# Altium footprint library SVP_Shared.PcbLib: 57 footprints (part 2 of 4)
Each footprint in its own frame and in the unit in brackets; x right, y up, seen from the top. Pads: shape width x height; smd on the part's side, far side on the other; paste and mask are expansions set on the pad; w line width, h text height; cw(c..) or ccw(c..) is an arc to the next point about the centre after c.
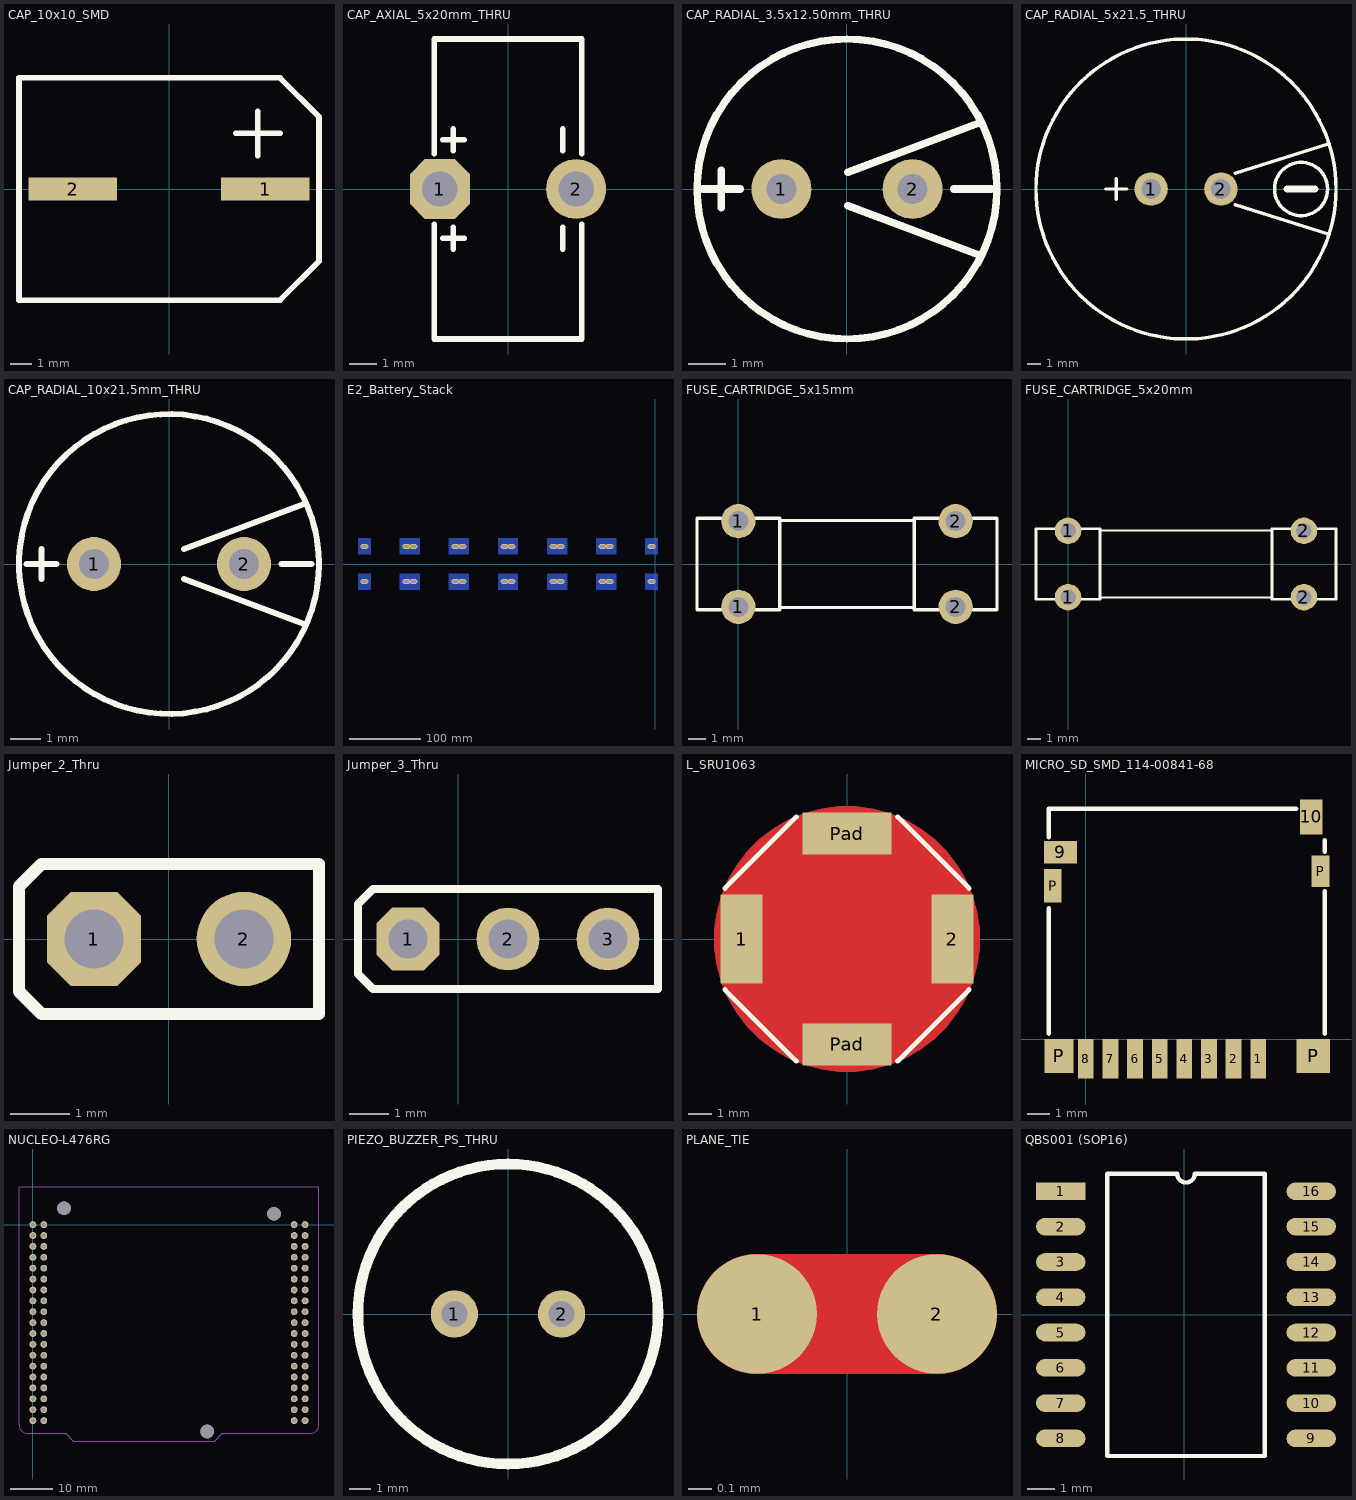
[diagram p1: the footprints below, top view; thin cyan lines are the x and y axes]

## CAP_10x10_SMD [mm]
pads (2):
  rect 4.064x1.05 smd: 1(4.4,0) 2(-4.4,0)
Top Overlay:
  lines w0.254: 3.048,2.54 5.08,2.54 ; 4.064,1.524 4.064,3.556 ; -6.858,-5.08 5.08,-5.08 6.858,-3.302 6.858,3.302 5.08,5.08 -6.858,5.08 -6.858,-5.08
3D body "User Library-cap_10x10x10-1.STEP": height 10.51, standoff 0.01, extent -5.899,-5.25 5.901,5.25

## CAP_AXIAL_5x20mm_THRU [mm] "Axial, Can - Vertical"
height 19.5
pads (2):
  oct 2.2x2.2 hole 1.3: 1(-2.5,0)
  round 2.2 hole 1.3: 2(2.5,0)
Top Overlay:
  lines w0.203: -2.7,-1.3 -2.7,-5.5 2.7,-5.5 2.7,-1.3 ; -2.7,1.3 -2.7,5.5 2.7,5.5 2.7,1.3 ; -2.4,-1.8 -1.6,-1.8 ; -2.4,1.8 -1.6,1.8 ; -2,-2.2 -2,-1.4 ; -2,1.4 -2,2.2 ; 2,-2.2 2,-1.4 ; 2,1.4 2,2.2
3D body: height 19.5, standoff 0.5, extent -2.5,-9.497 2.5,9.497
3D body: height 10, standoff -3, extent -2.7,-0.5 -2.5,0.5
3D body: height 17, standoff 3, extent -2.7,-7.098 -2.5,6.898
3D body: height 17, standoff 3, extent 2.5,-6.898 2.7,7.098
3D body: height 10, standoff -3, extent 2.5,-0.5 2.7,0.5

## CAP_RADIAL_3.5x12.50mm_THRU [mm]
height 12.5
pads (2):
  round 1.6 hole 0.8: 1(-1.75,0) 2(1.75,0)
Top Overlay:
  circle w0.2: c0,0 r4
  lines w0.203: -3.85,0 -2.85,0 ; -3.35,-0.5 -3.35,0.5 ; 0.021,-0.445 3.517,-1.756 ; 0.021,0.445 3.517,1.756 ; 2.85,0 3.85,0
3D body "User Library-Cap-EL(8x12-3_5)T.step": height 12.31, standoff -3.29, extent -4,-4 4.002,4

## CAP_RADIAL_5x21.5_THRU [mm] "Radial Capacitor 5mm lead spacing, 21.5mm diameter, 8mm tall"
height 8
pads (2):
  round 2.4 hole 1.4: 1(-2.5,0) 2(2.5,0)
Top Overlay:
  circle w0.25: c0,0 r10.75
  circle w0.25: c8.25,0 r1.904
  lines w0.25: -5.75,0 -4.25,0 ; -5,-0.75 -5,0.75 ; 3.54,-1.123 10.25,-3.25 ; 3.54,1.123 10.25,3.25
  lines w0.5: 7.25,0 9.25,0
3D body "User Library-Ionistor.step": height 8.01, standoff -6, extent -10.75,-10.75 10.76,10.75

## CAP_RADIAL_10x21.5mm_THRU [mm] "Aluminum Capacitor Radial"
height 21.5
pads (2):
  round 1.8 hole 1: 1(-2.5,0) 2(2.5,0)
Top Overlay:
  circle w0.2: c0,0 r5
  lines w0.203: -4.75,0 -3.75,0 ; -4.25,-0.5 -4.25,0.5 ; 0.5,-0.5 4.5,-2 ; 0.5,0.5 4.5,2 ; 3.75,0 4.75,0
3D body "User Library-Cap-EL(10x20-5).step": height 20, standoff -3.3, extent -5,-5 5.002,5

## E2_Battery_Stack [mil] "Preliminary Battery Stack for E2"
pads (24):
  oval 440x260 hole 120 slot 300 at 0 deg: 1(-196.85,969.27) 2(-2913.39,969.27) 2(-2519.68,969.27) 3(-5629.92,969.26) 3(-5236.22,969.26) 4(-8346.46,969.26) 4(-7952.76,969.26) 5(-11062.99,969.25) 5(-10669.29,969.25) 6(-13779.53,969.25) 6(-13385.83,969.25) 7(-16102.36,-969.24) 7(-16102.36,969.24) 8(-13779.53,-969.25) 8(-13385.83,-969.25) 9(-11062.99,-969.25) 9(-10669.29,-969.25) 10(-8346.46,-969.26) 10(-7952.76,-969.26) 11(-5629.92,-969.26) 11(-5236.22,-969.26) 12(-2913.39,-969.27) 12(-2519.68,-969.27) 13(-196.85,-969.27)
Top Layer:
  lines w256: -13779.53,-969.25 -13385.83,-969.25 ; -13779.53,969.25 -13385.83,969.25 ; -11062.99,-969.25 -10669.29,-969.25 ; -11062.99,969.25 -10669.29,969.25 ; -8346.46,-969.26 -7952.76,-969.26 ; -8346.46,969.26 -7952.76,969.26 ; -5629.92,-969.26 -5236.22,-969.26 ; -5629.92,969.26 -5236.22,969.26 ; -2913.39,-969.27 -2519.68,-969.27 ; -2913.39,969.27 -2519.68,969.27
Bottom Layer:
  pour cut-out: -14133.86,-551.16 -14133.86,-1417.3 -13031.5,-1417.3 -13031.5,-551.16
  pour cut-out: -3267.72,-551.18 -3267.72,-1417.32 -2165.35,-1417.32 -2165.35,-551.18
  pour cut-out: -551.18,-551.18 -551.18,-1417.32 157.48,-1417.32 157.48,-551.18
  pour cut-out: -11417.32,-551.16 -11417.32,-1417.3 -10314.96,-1417.3 -10314.96,-551.16
  pour cut-out: -8700.79,-551.17 -8700.79,-1417.31 -7598.43,-1417.31 -7598.43,-551.17
  pour cut-out: -5984.25,-551.17 -5984.25,-1417.31 -4881.89,-1417.31 -4881.89,-551.17
  pour cut-out: -16456.69,-551.15 -16456.69,-1417.29 -15748.03,-1417.29 -15748.03,-551.15
  pour cut-out: -16456.69,551.15 -16456.69,1417.29 -15748.03,1417.29 -15748.03,551.15
  pour cut-out: -5984.25,551.17 -5984.25,1417.31 -4881.89,1417.31 -4881.89,551.17
  pour cut-out: -8700.79,551.17 -8700.79,1417.31 -7598.43,1417.31 -7598.43,551.17
  pour cut-out: -11417.32,551.16 -11417.32,1417.3 -10314.96,1417.3 -10314.96,551.16
  pour cut-out: -551.18,551.18 -551.18,1417.32 157.48,1417.32 157.48,551.18
  pour cut-out: -3267.72,551.18 -3267.72,1417.32 -2165.35,1417.32 -2165.35,551.18
  pour cut-out: -14133.86,551.16 -14133.86,1417.3 -13031.5,1417.3 -13031.5,551.16
  lines w256: -13779.53,-969.25 -13385.83,-969.25 ; -13779.53,969.25 -13385.83,969.25 ; -11062.99,-969.25 -10669.29,-969.25 ; -11062.99,969.25 -10669.29,969.25 ; -8346.46,-969.26 -7952.76,-969.26 ; -8346.46,969.26 -7952.76,969.26 ; -5629.92,-969.26 -5236.22,-969.26 ; -5629.92,969.26 -5236.22,969.26 ; -2913.39,-969.27 -2519.68,-969.27 ; -2913.39,969.27 -2519.68,969.27
3D body "E2_BatteryStackConcept.STEP": height 2616.64, standoff 0.49, extent -16377.95,-2712.93 0,2712.94
3D body "92196A108_18-8 STAINLESS STEEL SOCKET HEAD CAP SCREW.STEP": height 112.5, standoff -374.5, extent -288.35,877.77 -105.34,1060.77
3D body "92196A108_18-8 STAINLESS STEEL SOCKET HEAD CAP SCREW.STEP": height 112.5, standoff -374.5, extent -2611.18,877.77 -2428.18,1060.77
3D body "92196A108_18-8 STAINLESS STEEL SOCKET HEAD CAP SCREW.STEP": height 112.5, standoff -374.5, extent -3004.88,877.77 -2821.88,1060.77
3D body "92196A108_18-8 STAINLESS STEEL SOCKET HEAD CAP SCREW.STEP": height 112.5, standoff -374.5, extent -5327.72,877.76 -5144.71,1060.76
3D body "92196A108_18-8 STAINLESS STEEL SOCKET HEAD CAP SCREW.STEP": height 112.5, standoff -374.5, extent -5721.42,877.76 -5538.42,1060.76
3D body "92196A108_18-8 STAINLESS STEEL SOCKET HEAD CAP SCREW.STEP": height 112.5, standoff -374.5, extent -8044.25,877.76 -7861.25,1060.76
3D body "92196A108_18-8 STAINLESS STEEL SOCKET HEAD CAP SCREW.STEP": height 112.5, standoff -374.5, extent -8437.95,877.76 -8254.95,1060.76
3D body "92196A108_18-8 STAINLESS STEEL SOCKET HEAD CAP SCREW.STEP": height 112.5, standoff -374.5, extent -10760.79,877.75 -10577.79,1060.75
3D body "92196A108_18-8 STAINLESS STEEL SOCKET HEAD CAP SCREW.STEP": height 112.5, standoff -374.5, extent -11154.49,877.75 -10971.49,1060.75
3D body "92196A108_18-8 STAINLESS STEEL SOCKET HEAD CAP SCREW.STEP": height 112.5, standoff -374.5, extent -13477.32,877.75 -13294.32,1060.75
3D body "92196A108_18-8 STAINLESS STEEL SOCKET HEAD CAP SCREW.STEP": height 112.5, standoff -374.5, extent -13871.02,877.75 -13688.02,1060.75
3D body "92196A108_18-8 STAINLESS STEEL SOCKET HEAD CAP SCREW.STEP": height 112.5, standoff -374.5, extent -16193.86,877.74 -16010.86,1060.74
3D body "92196A108_18-8 STAINLESS STEEL SOCKET HEAD CAP SCREW.STEP": height 112.5, standoff -374.5, extent -16193.86,-1060.74 -16010.86,-877.74
3D body "92196A108_18-8 STAINLESS STEEL SOCKET HEAD CAP SCREW.STEP": height 112.5, standoff -374.5, extent -13871.02,-1060.75 -13688.02,-877.74
3D body "92196A108_18-8 STAINLESS STEEL SOCKET HEAD CAP SCREW.STEP": height 112.5, standoff -374.5, extent -13477.32,-1060.75 -13294.32,-877.74
3D body "92196A108_18-8 STAINLESS STEEL SOCKET HEAD CAP SCREW.STEP": height 112.5, standoff -374.5, extent -11154.49,-1060.75 -10971.49,-877.75
3D body "92196A108_18-8 STAINLESS STEEL SOCKET HEAD CAP SCREW.STEP": height 112.5, standoff -374.5, extent -10760.79,-1060.75 -10577.79,-877.75
3D body "92196A108_18-8 STAINLESS STEEL SOCKET HEAD CAP SCREW.STEP": height 112.5, standoff -374.5, extent -8437.95,-1060.76 -8254.95,-877.75
3D body "92196A108_18-8 STAINLESS STEEL SOCKET HEAD CAP SCREW.STEP": height 112.5, standoff -374.5, extent -8044.25,-1060.76 -7861.25,-877.75
3D body "92196A108_18-8 STAINLESS STEEL SOCKET HEAD CAP SCREW.STEP": height 112.5, standoff -374.5, extent -5721.42,-1060.76 -5538.42,-877.76
3D body "92196A108_18-8 STAINLESS STEEL SOCKET HEAD CAP SCREW.STEP": height 112.5, standoff -374.5, extent -5327.72,-1060.76 -5144.71,-877.76
3D body "92196A108_18-8 STAINLESS STEEL SOCKET HEAD CAP SCREW.STEP": height 112.5, standoff -374.5, extent -3004.88,-1060.77 -2821.88,-877.76
3D body "92196A108_18-8 STAINLESS STEEL SOCKET HEAD CAP SCREW.STEP": height 112.5, standoff -374.5, extent -2611.18,-1060.77 -2428.18,-877.76
3D body "92196A108_18-8 STAINLESS STEEL SOCKET HEAD CAP SCREW.STEP": height 112.5, standoff -374.5, extent -288.35,-1060.77 -105.34,-877.77

## FUSE_CARTRIDGE_5x15mm [mm]
pads (4):
  round 2 hole 1.17: 1(0,-2.5) 1(0,2.5) 2(12.7,-2.5) 2(12.7,2.5)
Top Overlay:
  lines w0.152: 2.413,-2.54 10.287,-2.54 ; 2.413,2.54 10.287,2.54
  lines w0.203: -1.016,-2.667 -2.413,-2.667 -2.413,2.667 -1.016,2.667 ; 1.016,-2.667 2.413,-2.667 2.413,2.667 1.016,2.667 ; 11.684,-2.667 10.287,-2.667 10.287,2.667 11.684,2.667 ; 13.716,-2.667 15.113,-2.667 15.113,2.667 13.716,2.667
3D body "User Library-01110501Z.step": height 7.11, standoff -3.24, extent -2.35,-2.55 2.45,2.55
3D body "User Library-01110501Z.step": height 7.11, standoff -3.24, extent 10.25,-2.55 15.05,2.55

## FUSE_CARTRIDGE_5x20mm [mm]
pads (4):
  round 2 hole 1.17: 1(0,-2.5) 1(0,2.5) 2(17.78,-2.5) 2(17.78,2.5)
Top Overlay:
  lines w0.152: 2.413,-2.54 15.367,-2.54 ; 2.413,2.54 15.367,2.54
  lines w0.203: -1.016,-2.667 -2.413,-2.667 -2.413,2.667 -1.016,2.667 ; 1.016,-2.667 2.413,-2.667 2.413,2.667 1.016,2.667 ; 16.764,-2.667 15.367,-2.667 15.367,2.667 16.764,2.667 ; 18.796,-2.667 20.193,-2.667 20.193,2.667 18.796,2.667
3D body "User Library-01110501Z.step": height 7.11, standoff -3.24, extent -2.35,-2.55 2.45,2.55
3D body "User Library-01110501Z.step": height 7.11, standoff -3.24, extent 15.35,-2.55 20.15,2.55
3D body "User Library-FUSIVEL.step": height 7.33, standoff 2.33, extent -1.11,-2.5 18.89,2.5

## Jumper_2_Thru [mm]
pads (2):
  oct 1.6x1.6 hole 1: 1(-1.27,0)
  round 1.6 hole 1: 2(1.27,0)
Top Overlay:
  lines w0.203: -2.54,-0.889 -2.159,-1.27 2.54,-1.27 2.54,1.27 -2.159,1.27 -2.54,0.889 -2.54,-0.889
3D body "961102-6404-XX.stp": height 8.01, standoff -3.29, extent -2.54,-1.25 2.54,1.25

## Jumper_3_Thru [mm]
pads (3):
  oct 1.6x1.6 hole 1: 1(-1.27,0)
  round 1.6 hole 1: 2(1.27,0) 3(3.81,0)
Top Overlay:
  lines w0.203: -2.54,-0.889 -2.159,-1.27 5.08,-1.27 5.08,1.27 -2.159,1.27 -2.54,0.889 -2.54,-0.889
3D body "961103-6404-XX.stp": height 8.01, standoff -3.29, extent -2.54,-1.27 5.08,1.23

## L_SRU1063 [mm] "FIXED IND 22UH 3A 60 MOHM SMD"
pads (4):
  rect 1.8x3.8 smd: 1(-4.5,0) 2(4.5,0)
  rect 3.8x1.8 smd: Pad(0,-4.5) Pad(0,4.5)
Top Layer:
  pour cut-out: -4,4 -4.262,3.738 -4.714,3.15 -5.084,2.507 -5.368,1.822 -5.56,1.106 -5.657,0.371 -5.657,-0.371 -5.56,-1.106 -5.368,-1.822 -5.084,-2.507 -4.714,-3.15 -4.262,-3.738 -4,-4 -3.738,-4.262 -3.15,-4.714 -2.507,-5.084 -1.822,-5.368 -1.106,-5.56 -0.371,-5.657 0.371,-5.657 1.106,-5.56 1.822,-5.368 2.507,-5.084 3.15,-4.714 3.738,-4.262 4,-4 4.262,-3.738 4.714,-3.15 5.084,-2.507 5.368,-1.822 5.56,-1.106 5.657,-0.371 5.657,0.371 5.56,1.106 5.368,1.822 5.084,2.507 4.714,3.15 4.262,3.738 4,4 3.738,4.262 3.15,4.714 2.507,5.084 1.822,5.368 1.106,5.56 0.371,5.657 -0.371,5.657 -1.106,5.56 -1.822,5.368 -2.507,5.084 -3.15,4.714 -3.738,4.262
Bottom Layer:
  pour cut-out: -4,4 -4.262,3.738 -4.714,3.15 -5.084,2.507 -5.368,1.822 -5.56,1.106 -5.657,0.371 -5.657,-0.371 -5.56,-1.106 -5.368,-1.822 -5.084,-2.507 -4.714,-3.15 -4.262,-3.738 -4,-4 -3.738,-4.262 -3.15,-4.714 -2.507,-5.084 -1.822,-5.368 -1.106,-5.56 -0.371,-5.657 0.371,-5.657 1.106,-5.56 1.822,-5.368 2.507,-5.084 3.15,-4.714 3.738,-4.262 4,-4 4.262,-3.738 4.714,-3.15 5.084,-2.507 5.368,-1.822 5.56,-1.106 5.657,-0.371 5.657,0.371 5.56,1.106 5.368,1.822 5.084,2.507 4.714,3.15 4.262,3.738 4,4 3.738,4.262 3.15,4.714 2.507,5.084 1.822,5.368 1.106,5.56 0.371,5.657 -0.371,5.657 -1.106,5.56 -1.822,5.368 -2.507,5.084 -3.15,4.714 -3.738,4.262
Top Overlay:
  lines w0.203: -5.207,-2.159 -2.159,-5.207 ; -5.207,2.159 -2.159,5.207 ; 2.159,-5.207 5.207,-2.159 ; 2.159,5.207 5.207,2.159
3D body "sru1063.stp": height 6.51, standoff 0.01, extent -5,-5 5,5

## MICRO_SD_SMD_114-00841-68 [mm] "CONN MICRO SD CARD PUSH-PUSH R/A"
height 0.5
pads (14):
  rect 0.7x1.75 smd: 1(7.7,-0.875) 2(6.6,-0.875) 3(5.5,-0.875) 4(4.4,-0.875) 5(3.3,-0.875) 6(2.2,-0.875) 7(1.1,-0.875) 8(0,-0.875)
  rect 1.475x1 smd: 9(-1.138,8.35)
  rect 1x1.55 smd: 10(10.075,9.925)
  rect 0.8x1.5 smd: P(-1.475,6.85)
  rect 1.3x1.5 smd: P(-1.2,-0.75)
  rect 1.5x1.5 smd: P(10.15,-0.75)
  rect 0.8x1.4 smd: P(10.475,7.5)
Top Overlay:
  lines w0.203: -1.651,0.254 -1.651,5.842 ; -1.651,9.017 -1.651,10.287 9.398,10.287 ; 10.668,0.254 10.668,6.604 ; 10.668,8.382 10.668,8.89
3D body "User Library-Micro_SD.step": height 1.25, standoff 0.27, extent -0.925,-5.5 10.075,9.5
3D body "User Library-Micro SD Holder 114-00841-68.step": height 1.61, standoff 0.01, extent -1.45,-1.45 10.55,10.15

## NUCLEO-L476RG [mm] "STM32L4RG Nucleo Shield"
pads (79):
  round 1.6 hole 1: 1(0,0) 2(2.54,0) 3(0,-2.54) 4(2.54,-2.54) 5(0,-5.08) 6(2.54,-5.08) 7(0,-7.62) 8(2.54,-7.62) 9(0,-10.16) 10(2.54,-10.16) 11(0,-12.7) 12(2.54,-12.7) 13(0,-15.24) 14(2.54,-15.24) 15(0,-17.78) 16(2.54,-17.78) 17(0,-20.32) 18(2.54,-20.32) 19(0,-22.86) 20(2.54,-22.86) 21(0,-25.4) 22(2.54,-25.4) 23(0,-27.94) 24(2.54,-27.94) 25(0,-30.48) 26(2.54,-30.48) 27(0,-33.02) 28(2.54,-33.02) 29(0,-35.56) 30(2.54,-35.56) 31(0,-38.1) 32(2.54,-38.1) 33(0,-40.64) 34(2.54,-40.64) 35(0,-43.18) 36(2.54,-43.18) 37(0,-45.72) 38(2.54,-45.72) 39(60.96,0) 40(63.5,0) 41(60.96,-2.54) 42(63.5,-2.54) 43(60.96,-5.08) 44(63.5,-5.08) 45(60.96,-7.62) 46(63.5,-7.62) 47(60.96,-10.16) 48(63.5,-10.16) 49(60.96,-12.7) 50(63.5,-12.7) 51(60.96,-15.24) 52(63.5,-15.24) 53(60.96,-17.78) 54(63.5,-17.78) 55(60.96,-20.32) 56(63.5,-20.32) 57(60.96,-22.86) 58(63.5,-22.86) 59(60.96,-25.4) 60(63.5,-25.4) 61(60.96,-27.94) 62(63.5,-27.94) 63(60.96,-30.48) 64(63.5,-30.48) 65(60.96,-33.02) 66(63.5,-33.02) 67(60.96,-35.56) 68(63.5,-35.56) 69(60.96,-38.1) 70(63.5,-38.1) 71(60.96,-40.64) 72(63.5,-40.64) 73(60.96,-43.18) 74(63.5,-43.18) 75(60.96,-45.72) 76(63.5,-45.72)
  round 3.175 hole 3.175 unplated: ""(7.26,3.81) ""(40.64,-48.26) ""(56.24,2.54)
Bottom Overlay:
  lines w0.203: -1.27,-47.269 -1.27,1.549 3.81,1.549 3.81,-47.269 -1.27,-47.269 ; 59.69,-47.269 64.77,-47.269 64.77,1.549 59.69,1.549 59.69,-47.269
Mechanical 1:
  lines w0.203: -3.25,-46.7 ccw(c-1.25,-46.7) -1.25,-48.7 7.61,-48.7 9.41,-50.5 42.41,-50.5 44.21,-48.7 64.75,-48.7 ccw(c64.75,-46.7) 66.75,-46.7 66.75,8.8 -3.25,8.8 -3.25,-46.7
3D body: height 8.5, standoff 0, extent -1.27,-47.26 3.81,1.54
3D body: height 8.5, standoff 0, extent 59.69,-47.26 64.77,1.54
3D body: height 8.5, standoff 0, extent 6.35,-46.99 8.89,-31.75
3D body: height 8.5, standoff 0, extent 6.35,-29.21 8.89,-8.89
3D body: height 8.5, standoff 0, extent 54.61,-27.94 57.15,0
3D body: height 8.5, standoff 0, extent 54.61,-46.99 57.15,-29.21

## PIEZO_BUZZER_PS_THRU [mm] "Thru Hole Piezo Buzzer 14mm diameter, 5mm pitch"
height 8
pads (2):
  round 2.2 hole 1.2: 1(-2.5,0) 2(2.5,0)
Top Overlay:
  circle w0.5: c0,0 r7
3D body "cpe-244.stp": height 9.51, standoff -6.49, extent -7,-7 7,7

## PLANE_TIE [mil]
pads (2):
  round 20 smd paste-10: 1(-15,0) 2(15,0)
Top Layer:
  lines w20: -15,0 15,0

## QBS001 (SOP16) [mil] "Isolation Transformer Package"
pads (16):
  rect 70x25 smd: 1(-174.84,175)
  oval 70x25 smd: 2(-174.84,125) 3(-174.84,75) 4(-174.84,25) 5(-174.84,-25) 6(-174.84,-75) 7(-174.84,-125) 8(-174.84,-175) 9(180.16,-175) 10(180.16,-125) 11(180.16,-75) 12(180.16,-25) 13(180.16,25) 14(180.16,75) 15(180.16,125) 16(180.16,175)
Top Overlay:
  lines w6: -108.84,-200 -108.84,200 -9.84,200 ccw(c2.66,200) 15.16,200 114.16,200 114.16,-200 -108.84,-200
3D body "User Library-Halo_SMD10base-T Module.step": height 198.9, standoff 0.48, extent -187.18,-250 187.5,250